# Altium footprint library Connectors.PcbLib: 72 footprints (part 5 of 5)
Each footprint in its own frame and in the unit in brackets; x right, y up, seen from the top. Pads: shape width x height; smd on the part's side, far side on the other; paste and mask are expansions set on the pad; w line width, h text height; cw(c..) or ccw(c..) is an arc to the next point about the centre after c.
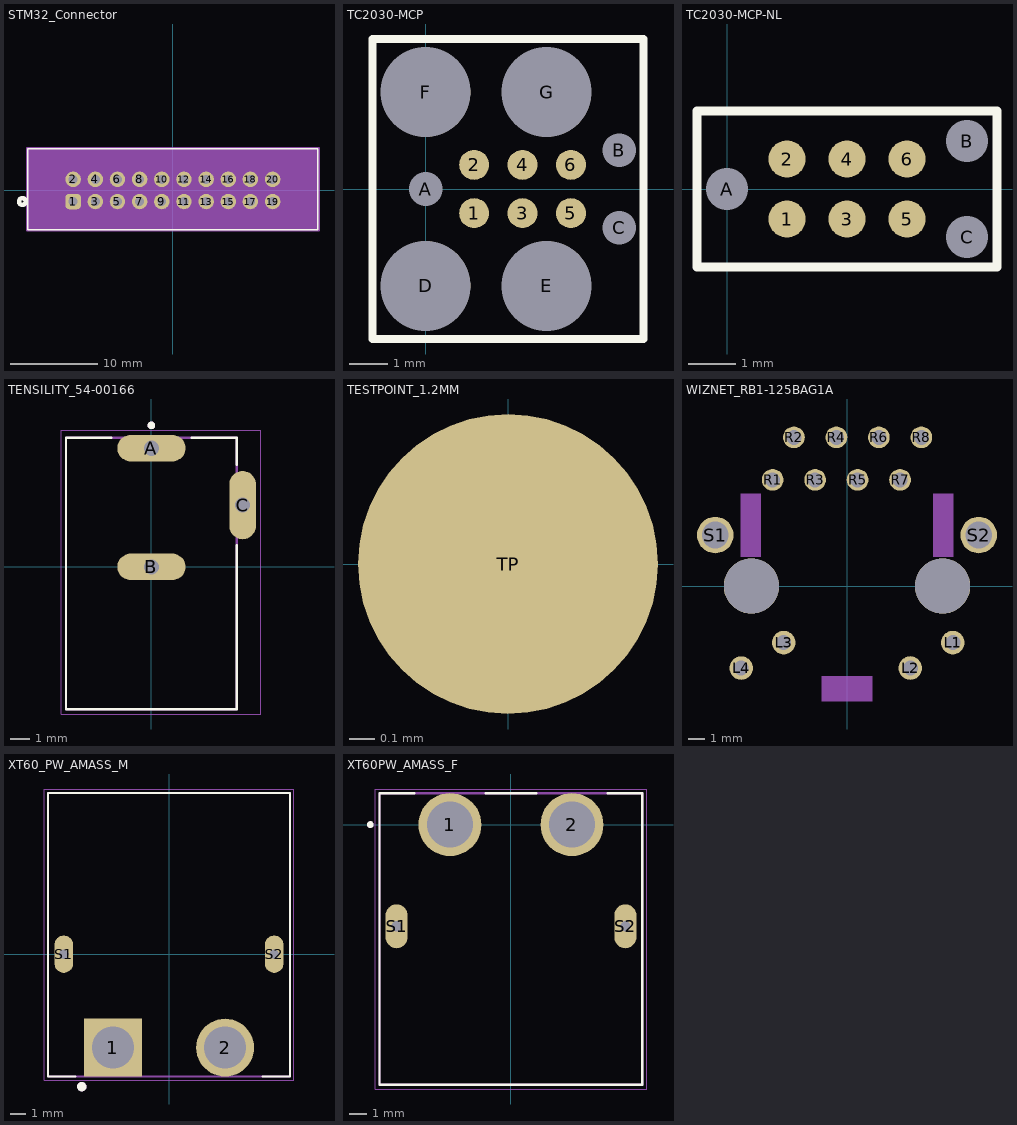
[diagram p4: the footprints below, top view; thin cyan lines are the x and y axes]

## STM32_Connector [mil]
pads (20):
  rrect50% 70x70 hole 40 paste-99999 mask+0: 1(-450,-50)
  round 70 hole 40 paste-99999 mask+0: 2(-450,50) 3(-350,-50) 4(-350,50) 5(-250,-50) 6(-250,50) 7(-150,-50) 8(-150,50) 9(-50,-50) 10(-50,50) 11(50,-50) 12(50,50) 13(150,-50) 14(150,50) 15(250,-50) 16(250,50) 17(350,-50) 18(350,50) 19(450,-50) 20(450,50)
Top Overlay:
  circle w20: c-679.5,-50 r15
  lines w6: -654.5,-177.93 -654.5,188.07 654.5,188.07 654.5,-177.93 -654.5,-177.93
Bottom Overlay:
  circle w20: c-679.5,-50 r15
Mechanical 13:
  circle w20: c-450,-125 r15
  lines w1: -649.5,-172.93 -649.5,183.07 649.5,183.07 649.5,-172.93 -649.5,-172.93
Mechanical 15:
  region: 659.5,196 -659.5,196 -659.5,-180 659.5,-180
  lines w6: -659.5,-182.93 659.5,-182.93 659.5,193.07 -659.5,193.07 -659.5,-182.93

## TC2030-MCP [mil]
pads (13):
  round 31 smd: 1(50,-25) 2(50,25) 3(100,-25) 4(100,25) 5(150,-25) 6(150,25)
  round 34 hole 35 unplated: A(0,0) B(200,40) C(200,-40)
  round 92 hole 93 unplated: D(0,-100) E(125,-100) F(0,100) G(125,100)
Top Overlay:
  lines w7.87: -55,-155 -55,155 225,155 225,-155 -55,-155

## TC2030-MCP-NL [mil]
pads (9):
  round 31 smd: 1(50,-25) 2(50,25) 3(100,-25) 4(100,25) 5(150,-25) 6(150,25)
  round 34 hole 35 unplated: A(0,0) B(200,40) C(200,-40)
Top Overlay:
  lines w7.87: -25,-65 225,-65 225,65 -25,65 -25,-65

## TENSILITY_54-00166 [mm]
height 11.2
pads (3):
  oval 3.6x1.4 hole 0.8 square mask+0.05: A(0,6.25) B(0,0)
  oval 1.4x3.6 hole 0.8 square mask+0.05: C(4.8,3.25)
Top Overlay:
  circle w0.2: c0,7.45 r0.1
  lines w0.127: -2.12,6.8 -4.5,6.8 -4.5,-7.5 4.5,-7.5 4.5,1.13 ; 2.12,6.8 4.5,6.8 4.5,5.37
Mechanical 13:
  circle w0.2: c0,7.45 r0.1
  lines w0.127: -4.5,-7.5 4.5,-7.5 4.5,6.8 -4.5,6.8 -4.5,-7.5
Mechanical 15:
  lines w0.05: -4.75,-7.75 -4.75,7.2 5.75,7.2 5.75,-7.75 -4.75,-7.75
3D body "step_temp.STEP": height 11, standoff -3.6, extent -4.496,-7.569 5.004,6.731

## TESTPOINT_1.2MM [mm]
pads (1):
  round 1.2 smd: TP(0,0)

## WIZNET_RB1-125BAG1A [mm]
pads (16):
  round 1.408 hole 0.9: L1(6.325,-3.38) L2(3.784,-4.899) L3(-3.786,-3.379) L4(-6.325,-4.9)
  round 1.3 hole 0.9: R1(-4.446,6.349) R2(-3.176,8.889) R3(-1.906,6.349) R4(-0.636,8.889) R5(0.634,6.349) R6(1.904,8.889) R7(3.174,6.349) R8(4.444,8.889)
  round 2.184 hole 1.6: S1(-7.876,3.049) S2(7.874,3.049)
  round 3.3 hole 3.3 unplated: ""(-5.716,-0.001) ""(5.714,-0.001)
Mechanical 13:
  region: -5.15,1.756 -6.36,1.756 -6.36,5.528 -5.15,5.528
  region: 6.348,1.756 5.156,1.756 5.156,5.528 6.348,5.528
  region: 1.5,-6.9 -1.5,-6.9 -1.5,-5.4 1.5,-5.4
3D body "RB1-125BAG1A--3DModel-STEP-56544.STEP": height 14.36, standoff -3.34, extent -8.875,-10.922 8.875,10.858

## XT60_PW_AMASS_M [mm] "XT60 60A RIGHT ANGLE MALE"
pads (4):
  rect 3.716x3.716 hole 2.7: 1(-3.6,-6)
  round 3.716 hole 2.7: 2(3.6,-6)
  oval 1.2x2.4 hole 0.6 square: S1(-6.75,0) S2(6.75,0)
Top Overlay:
  circle w0.3: c-5.6,-8.5 r0.15
  lines w0.127: -6,-7.85 -7.75,-7.85 -7.75,10.35 7.75,10.35 7.75,-7.85 6,-7.85
Mechanical 13:
  circle w0.3: c-5.6,-8.5 r0.15
  lines w0.127: -7.75,-7.85 7.75,-7.85 7.75,10.35 -7.75,10.35 -7.75,-7.85
Mechanical 15:
  lines w0.05: -8,-8.1 -8,10.6 8,10.6 8,-8.1 -8,-8.1
3D body "XT60PW_RightAngle_M.STEP": height 8.52, standoff -2.43, extent -7.753,-7.874 7.747,10.326

## XT60PW_AMASS_F [mm] "XT60_AMASS_F"
pads (4):
  round 3.716 hole 2.7: 1(-3.6,0) 2(3.6,0)
  oval 1.3x2.6 hole 0.6 square: S1(-6.75,-6) S2(6.75,-6)
Top Overlay:
  circle w0.2: c-8.3,0 r0.1
  lines w0.127: -5.71,1.85 -7.75,1.85 -7.75,-15.35 7.75,-15.35 7.75,1.85 5.71,1.85 ; -1.49,1.85 1.49,1.85
Mechanical 13:
  circle w0.2: c-8.3,0 r0.1
  lines w0.127: -7.75,-15.35 -7.75,1.85 7.75,1.85 7.75,-15.35 -7.75,-15.35
Mechanical 15:
  lines w0.05: -8,-15.6 -8,2.1 8,2.1 8,-15.6 -8,-15.6
3D body "XT60PW_RightAngle_F.STEP": height 2.1, standoff -8.85, extent -7.75,-15.367 7.75,1.833